# Altium integrated library all_in_one_library.IntLib: 677 symbols (part 1 of 3)
Pins are listed as number, name and electrical type; pins without a type are passive.

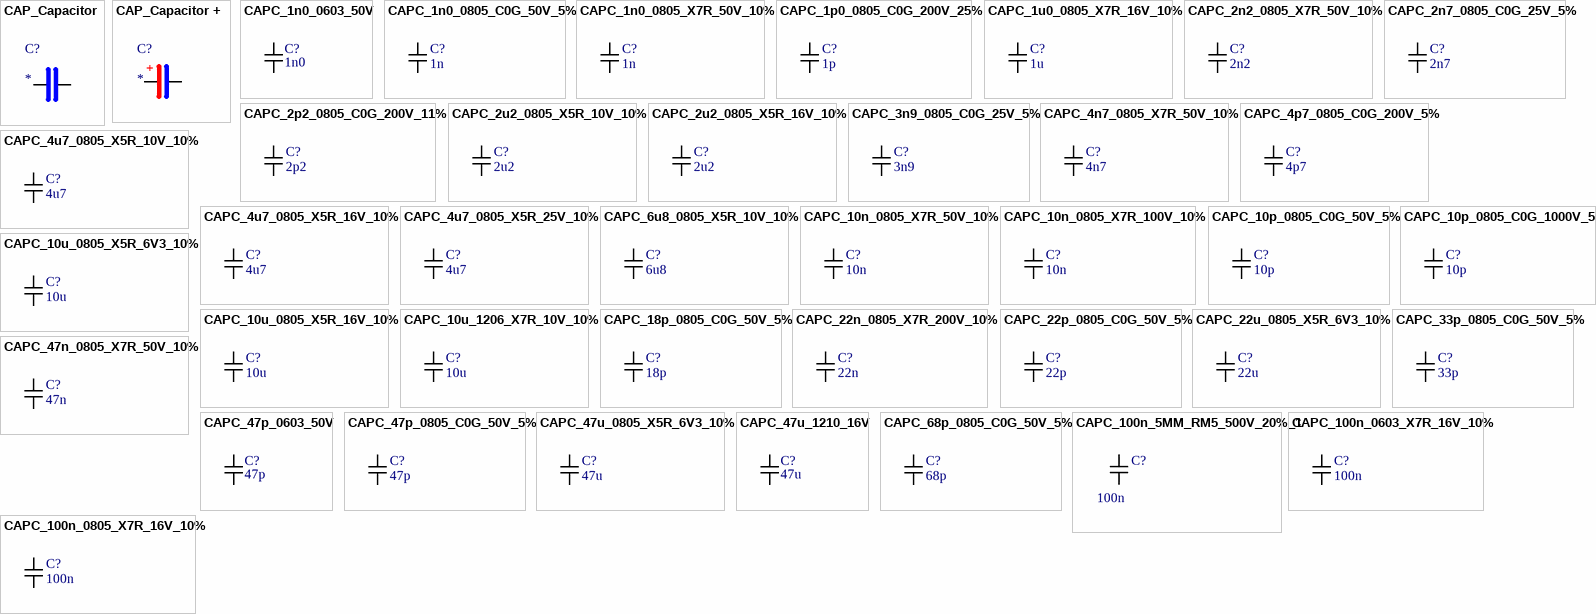
[diagram p0: symbols CAP_Capacitor to CAPC_100n_0805_X7R_16V_10%]

## CAP_Capacitor
designator C?
pins: 1, 2

## CAP_Capacitor +
designator C?
pins: 1, 2
text: +

## CAPC_1n0_0603_50V
designator C?, comment 1n0
CAPC_0603_1n0_50V
footprint CAPC_0603
pins: 1, 2

## CAPC_1n0_0805_C0G_50V_5%
designator C?  value 1n  (hidden comment: *)
CAPC 0805 1000pF; Material: ceramic; Tolerance [%]: ±5; Case [Metric]: 2012; Case [EIA]: 0805; Voltage [V]: 50; Dielectric: C0G
footprint CAPC_0805
pins: 1, 2

## CAPC_1n0_0805_X7R_50V_10%
designator C?  value 1n  (hidden comment: *)
CAPC 0805 1000pF; Material: ceramic; Tolerance [%]: ±10; Case [Metric]: 2012; Case [EIA]: 0805; Voltage [V]: 50; Dielectric: X7R
footprint CAPC_0805
pins: 1, 2

## CAPC_1p0_0805_C0G_200V_25%
designator C?  value 1p  (hidden comment: *)
CAPC 0805 1pF; Material: ceramic; Tolerance [%]: ±25; Case [Metric]: 2012; Case [EIA]: 0805; Voltage [V]: 200; Dielectric: C0G
footprint CAPC_0805
pins: 1, 2

## CAPC_1u0_0805_X7R_16V_10%
designator C?  value 1u  (hidden comment: *)
CAPC 0805 1000000pF; Material: ceramic; Tolerance [%]: ±10; Case [Metric]: 2012; Case [EIA]: 0805; Voltage [V]: 16; Dielectric: X7R
footprint CAPC_0805
pins: 1, 2

## CAPC_2n2_0805_X7R_50V_10%
designator C?  value 2n2  (hidden comment: *)
CAPC 0805 2200pF; Material: ceramic; Tolerance [%]: ±10; Case [Metric]: 2012; Case [EIA]: 0805; Voltage [V]: 50; Dielectric: X7R
footprint CAPC_0805
pins: 1, 2

## CAPC_2n7_0805_C0G_25V_5%
designator C?  value 2n7  (hidden comment: *)
CAPC 0805 2700pF; Material: ceramic; Tolerance [%]: ±5; Case [Metric]: 2012; Case [EIA]: 0805; Voltage [V]: 25; Dielectric: C0G
footprint CAPC_0805
pins: 1, 2

## CAPC_2p2_0805_C0G_200V_11%
designator C?  value 2p2  (hidden comment: *)
CAPC 0805 2.2pF; Material: ceramic; Tolerance [%]: ±11; Case [Metric]: 2012; Case [EIA]: 0805; Voltage [V]: 200; Dielectric: C0G
footprint CAPC_0805
pins: 1, 2

## CAPC_2u2_0805_X5R_10V_10%
designator C?  value 2u2  (hidden comment: *)
CAPC 0805 2200000pF; Material: ceramic; Tolerance [%]: ±10; Case [Metric]: 2012; Case [EIA]: 0805; Voltage [V]: 10; Dielectric: X5R
footprint CAPC_0805
pins: 1, 2

## CAPC_2u2_0805_X5R_16V_10%
designator C?  value 2u2  (hidden comment: *)
CAPC 0805 2200000pF; Material: ceramic; Tolerance [%]: ±10; Case [Metric]: 2012; Case [EIA]: 0805; Voltage [V]: 16; Dielectric: X5R
footprint CAPC_0805
pins: 1, 2

## CAPC_3n9_0805_C0G_25V_5%
designator C?  value 3n9  (hidden comment: *)
CAPC 0805 3900pF; Material: ceramic; Tolerance [%]: ±5; Case [Metric]: 2012; Case [EIA]: 0805; Voltage [V]: 25; Dielectric: C0G
footprint CAPC_0805
pins: 1, 2

## CAPC_4n7_0805_X7R_50V_10%
designator C?  value 4n7  (hidden comment: *)
CAPC 0805 4700pF; Material: ceramic; Tolerance [%]: ±10; Case [Metric]: 2012; Case [EIA]: 0805; Voltage [V]: 50; Dielectric: X7R
footprint CAPC_0805
pins: 1, 2

## CAPC_4p7_0805_C0G_200V_5%
designator C?  value 4p7  (hidden comment: *)
CAPC 0805 4.7pF; Material: ceramic; Tolerance [%]: ±5; Case [Metric]: 2012; Case [EIA]: 0805; Voltage [V]: 200; Dielectric: C0G
footprint CAPC_0805
pins: 1, 2

## CAPC_4u7_0805_X5R_10V_10%
designator C?  value 4u7  (hidden comment: *)
CAPC 0805 4700000pF; Material: ceramic; Tolerance [%]: ±10; Case [Metric]: 2012; Case [EIA]: 0805; Voltage [V]: 10; Dielectric: X5R
footprint CAPC_0805
pins: 1, 2

## CAPC_4u7_0805_X5R_16V_10%
designator C?  value 4u7  (hidden comment: *)
CAPC 0805 4700000pF; Material: ceramic; Tolerance [%]: ±10; Case [Metric]: 2012; Case [EIA]: 0805; Voltage [V]: 16; Dielectric: X5R
footprint CAPC_0805
pins: 1, 2

## CAPC_4u7_0805_X5R_25V_10%
designator C?  value 4u7  (hidden comment: *)
CAPC 0805 4700000pF; Material: ceramic; Tolerance [%]: ±10; Case [Metric]: 2012; Case [EIA]: 0805; Voltage [V]: 25; Dielectric: X5R
footprint CAPC_0805
pins: 1, 2

## CAPC_6u8_0805_X5R_10V_10%
designator C?  value 6u8  (hidden comment: *)
CAPC 0805 6800000pF; Material: ceramic; Tolerance [%]: ±10; Case [Metric]: 2012; Case [EIA]: 0805; Voltage [V]: 10; Dielectric: X5R
footprint CAPC_0805
pins: 1, 2

## CAPC_10n_0805_X7R_50V_10%
designator C?  value 10n  (hidden comment: *)
CAPC 0805 10000pF; Material: ceramic; Tolerance [%]: ±10; Case [Metric]: 2012; Case [EIA]: 0805; Voltage [V]: 50; Dielectric: X7R
footprint CAPC_0805
pins: 1, 2

## CAPC_10n_0805_X7R_100V_10%
designator C?  value 10n  (hidden comment: *)
CAPC 0805 10000pF; Material: ceramic; Tolerance [%]: ±10; Case [Metric]: 2012; Case [EIA]: 0805; Voltage [V]: 100; Dielectric: X7R
footprint CAPC_0805
pins: 1, 2

## CAPC_10p_0805_C0G_50V_5%
designator C?  value 10p  (hidden comment: *)
CAPC 0805 10pF; Material: ceramic; Tolerance [%]: ±5; Case [Metric]: 2012; Case [EIA]: 0805; Voltage [V]: 50; Dielectric: C0G
footprint CAPC_0805
pins: 1, 2

## CAPC_10p_0805_C0G_1000V_5%
designator C?  value 10p  (hidden comment: *)
CAPC 0805 10pF; Material: ceramic; Tolerance [%]: ±5; Case [Metric]: 2012; Case [EIA]: 0805; Voltage [V]: 1000; Dielectric: C0G
footprint CAPC_0805
pins: 1, 2

## CAPC_10u_0805_X5R_6V3_10%
designator C?  value 10u  (hidden comment: *)
CAPC 0805 10000000pF; Material: ceramic; Tolerance [%]: ±10; Case [Metric]: 2012; Case [EIA]: 0805; Dielectric: X5R; Voltage [V]: 6.3
footprint CAPC_0805
pins: 1, 2

## CAPC_10u_0805_X5R_16V_10%
designator C?  value 10u  (hidden comment: *)
CAPC 0805 10000000pF; Material: ceramic; Tolerance [%]: ±10; Case [Metric]: 2012; Case [EIA]: 0805; Voltage [V]: 16; Dielectric: X5R
footprint CAPC_0805
pins: 1, 2

## CAPC_10u_1206_X7R_10V_10%
designator C?  value 10u  (hidden comment: *)
CAPC 0805 10000000pF; Material: ceramic; Tolerance [%]: ±10; Case [Metric]: 3216; Case [EIA]: 1206; Dielectric: X7R; Voltage [V]: 10
footprint CAPC_1206
pins: 1, 2

## CAPC_18p_0805_C0G_50V_5%
designator C?  value 18p  (hidden comment: *)
CAPC 0805 18pF; Material: ceramic; Tolerance [%]: ±5; Case [Metric]: 2012; Case [EIA]: 0805; Voltage [V]: 50; Dielectric: C0G
footprint CAPC_0805
pins: 1, 2

## CAPC_22n_0805_X7R_200V_10%
designator C?  value 22n  (hidden comment: *)
CAPC 0805 22000pF; Material: ceramic; Tolerance [%]: ±10; Case [Metric]: 2012; Case [EIA]: 0805; Voltage [V]: 200; Dielectric: X7R
footprint CAPC_0805
pins: 1, 2

## CAPC_22p_0805_C0G_50V_5%
designator C?  value 22p  (hidden comment: *)
CAPC 0805 22pF; Material: ceramic; Tolerance [%]: ±5; Case [Metric]: 2012; Case [EIA]: 0805; Voltage [V]: 50; Dielectric: C0G
footprint CAPC_0805
pins: 1, 2

## CAPC_22u_0805_X5R_6V3_10%
designator C?  value 22u  (hidden comment: *)
CAPC 0805 22000000pF; Material: ceramic; Tolerance [%]: ±10; Case [Metric]: 2012; Case [EIA]: 0805; Dielectric: X5R; Voltage [V]: 6.3
footprint CAPC_0805
pins: 1, 2

## CAPC_33p_0805_C0G_50V_5%
designator C?  value 33p  (hidden comment: *)
CAPC 0805 33pF; Material: ceramic; Tolerance [%]: ±5; Case [Metric]: 2012; Case [EIA]: 0805; Voltage [V]: 50; Dielectric: C0G
footprint CAPC_0805
pins: 1, 2

## CAPC_47n_0805_X7R_50V_10%
designator C?  value 47n  (hidden comment: *)
CAPC 0805 47000pF; Material: ceramic; Tolerance [%]: ±10; Case [Metric]: 2012; Case [EIA]: 0805; Voltage [V]: 50; Dielectric: X7R
footprint CAPC_0805
pins: 1, 2

## CAPC_47p_0603_50V
designator C?, comment 47p
CAPC_0603_47p_50V
footprint CAPC_0603
pins: 1, 2

## CAPC_47p_0805_C0G_50V_5%
designator C?  value 47p  (hidden comment: *)
CAPC 0805 47pF; Material: ceramic; Tolerance [%]: ±5; Case [Metric]: 2012; Case [EIA]: 0805; Voltage [V]: 50; Dielectric: C0G
footprint CAPC_0805
pins: 1, 2

## CAPC_47u_0805_X5R_6V3_10%
designator C?  value 47u  (hidden comment: *)
CAPC 0805 47000000pF; Material: ceramic; Tolerance [%]: ±10; Case [Metric]: 2012; Case [EIA]: 0805; Dielectric: X5R; Voltage [V]: 6.3
footprint CAPC_0805
pins: 1, 2

## CAPC_47u_1210_16V
designator C?, comment 47u
CAPC_47u_1210_16V
footprint CAPC_1210
pins: 1, 2

## CAPC_68p_0805_C0G_50V_5%
designator C?  value 68p  (hidden comment: *)
CAPC 0805 68pF; Material: ceramic; Tolerance [%]: ±5; Case [Metric]: 2012; Case [EIA]: 0805; Voltage [V]: 50; Dielectric: C0G
footprint CAPC_0805
pins: 1, 2

## CAPC_100n_5MM_RM5_500V_20%_1
designator C?, comment 100n
CAPC 100nF 500V
footprint CAPC 5mm (ceramic HV)
pins: 1, 2

## CAPC_100n_0603_X7R_16V_10%
designator C?  value 100n  (hidden comment: *)
CAPC 0603 100000pF; Material: ceramic; Case [EIA]: 0603; Dielectric: X7R; Voltage: 16V; Tolerance: ±10%
footprint CAPC_0603
pins: 1, 2

## CAPC_100n_0805_X7R_16V_10%
designator C?  value 100n  (hidden comment: *)
CAPC 0805 100000pF; Material: ceramic; Tolerance [%]: ±10; Case [Metric]: 2012; Case [EIA]: 0805; Voltage [V]: 16; Dielectric: X7R
footprint CAPC_0805
pins: 1, 2

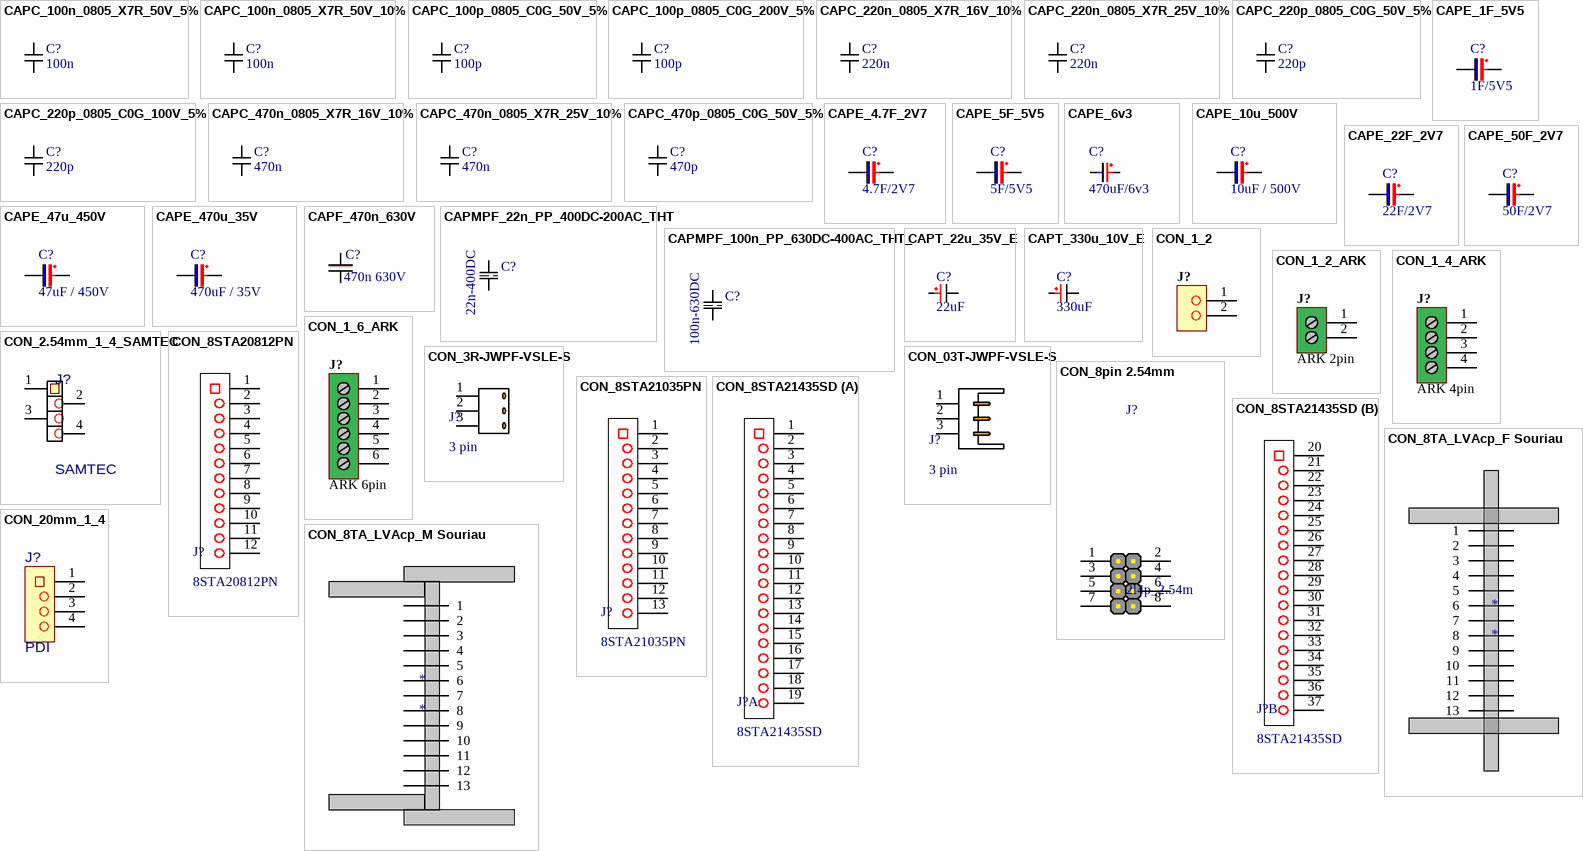
[diagram p1: symbols CAPC_100n_0805_X7R_50V_5% to CON_20mm_1_4]

## CAPC_100n_0805_X7R_50V_5%
designator C?  value 100n  (hidden comment: *)
CAPC 0805 100000pF; Material: ceramic; Tolerance [%]: ±5; Case [Metric]: 2012; Case [EIA]: 0805; Voltage [V]: 50; Dielectric: X7R
footprint CAPC_0805
pins: 1, 2

## CAPC_100n_0805_X7R_50V_10%
designator C?  value 100n  (hidden comment: *)
CAPC 0805 100000pF; Material: ceramic; Tolerance [%]: ±10; Case [Metric]: 2012; Case [EIA]: 0805; Voltage [V]: 50; Dielectric: X7R
footprint CAPC_0805
pins: 1, 2

## CAPC_100p_0805_C0G_50V_5%
designator C?  value 100p  (hidden comment: *)
CAPC 0805 100pF; Material: ceramic; Tolerance [%]: ±5; Case [Metric]: 2012; Case [EIA]: 0805; Voltage [V]: 50; Dielectric: C0G
footprint CAPC_0805
pins: 1, 2

## CAPC_100p_0805_C0G_200V_5%
designator C?  value 100p  (hidden comment: *)
CAPC 0805 100pF; Material: ceramic; Tolerance [%]: ±5; Case [Metric]: 2012; Case [EIA]: 0805; Voltage [V]: 200; Dielectric: C0G
footprint CAPC_0805
pins: 1, 2

## CAPC_220n_0805_X7R_16V_10%
designator C?  value 220n  (hidden comment: *)
CAPC 0805 220000pF; Material: ceramic; Tolerance [%]: ±10; Case [Metric]: 2012; Case [EIA]: 0805; Voltage [V]: 16; Dielectric: X7R
footprint CAPC_0805
pins: 1, 2

## CAPC_220n_0805_X7R_25V_10%
designator C?  value 220n  (hidden comment: *)
CAPC 0805 220000pF; Material: ceramic; Tolerance [%]: ±10; Case [Metric]: 2012; Case [EIA]: 0805; Voltage [V]: 25; Dielectric: X7R
footprint CAPC_0805
pins: 1, 2

## CAPC_220p_0805_C0G_50V_5%
designator C?  value 220p  (hidden comment: *)
CAPC 0805 220pF; Material: ceramic; Tolerance [%]: ±5; Case [Metric]: 2012; Case [EIA]: 0805; Voltage [V]: 50; Dielectric: C0G
footprint CAPC_0805
pins: 1, 2

## CAPC_220p_0805_C0G_100V_5%
designator C?  value 220p  (hidden comment: *)
CAPC 0805 220pF; Material: ceramic; Tolerance [%]: ±5; Case [Metric]: 2012; Case [EIA]: 0805; Voltage [V]: 100; Dielectric: C0G
footprint CAPC_0805
pins: 1, 2

## CAPC_470n_0805_X7R_16V_10%
designator C?  value 470n  (hidden comment: *)
CAPC 0805 470000pF; Material: ceramic; Tolerance [%]: ±10; Case [Metric]: 2012; Case [EIA]: 0805; Voltage [V]: 16; Dielectric: X7R
footprint CAPC_0805
pins: 1, 2

## CAPC_470n_0805_X7R_25V_10%
designator C?  value 470n  (hidden comment: *)
CAPC 0805 470000pF; Material: ceramic; Tolerance [%]: ±10; Case [Metric]: 2012; Case [EIA]: 0805; Voltage [V]: 25; Dielectric: X7R
footprint CAPC_0805
pins: 1, 2

## CAPC_470p_0805_C0G_50V_5%
designator C?  value 470p  (hidden comment: *)
CAPC 0805 470pF; Material: ceramic; Tolerance [%]: ±5; Case [Metric]: 2012; Case [EIA]: 0805; Voltage [V]: 50; Dielectric: C0G
footprint CAPC_0805
pins: 1, 2

## CAPE_1F_5V5
designator C?, comment 1F/5V5
Superkapacitor; Suplier: GES
footprint CAP_1F_21.5x8x5
pins: +, -

## CAPE_4.7F_2V7
designator C?, comment 4.7F/2V7
Superkapacitor DRL4.7/2.7; Suplier: TME; Alias: DRL4.7/2.7
footprint CAP_4F7_10x20x5mm
pins: +, -

## CAPE_5F_5V5
designator C?, comment 5F/5V5
Superkapacitor; Suplier: GES
footprint CAPE_5F_5V5
pins: +, -

## CAPE_6v3
designator C?, comment 470uF/6v3
Elektroliticky kondenzátor 8x12x4mm
footprint CAP 8x12x4mm
pins: +, -

## CAPE_10u_500V
designator C?, comment 10uF / 500V
Elektroliticky kondenzátor
footprint CAP 10x16x5mm+
pins: +, -

## CAPE_22F_2V7
designator C?, comment 22F/2V7
Superkapacitor DRL22/2.7; Suplier: TME; Alias: DRL22/2.7
footprint CAP_22F_16x25
pins: +, -

## CAPE_47u_450V
designator C?, comment 47uF / 450V
Elektroliticky kondenzátor; Alias: RAD 47/450 RM7,5; Suplier: GES
footprint CAP 16x36x7.5mm
pins: +, -

## CAPE_50F_2V7
designator C?, comment 50F/2V7
Superkapacitor DRL50/2.7; Suplier: TME; Alias: DRL50/2.7
footprint CAP_50F_18x40x
pins: +, -

## CAPE_470u_35V
designator C?, comment 470uF / 35V
Elektroliticky kondenzátor
footprint CAP 10x12.5x5mm+
pins: +, -

## CAPF_470n_630V
designator C?, comment 470n 630V
EPCOS - B32653A6474J - FOIL CAPACITOR, 0.47UF, 630V; Alias: B32653A6474J
footprint CAP B32653
pins: 1 +, 2 -

## CAPMPF_22n_PP_400DC-200AC_THT
designator C?, comment 22n-400DC
polypropylen foil 22n 400DC / 200AC; speed-grade: 600V/us; link: http://www.tme.eu/cz/details/mks2-22n_400-r/kondenzatory-tht-polyesterove/wima/mks2g022201c00ko00/; datasheet: http://www.tme.eu/cz/Document/c7e8f087b5b5822d15279eb1943cea1e/WIMA_MKS_2.pdf
footprint WIMA_3.5_8.5_7.2_5rm (polypropylen capacitor)
pins: 1, 2

## CAPMPF_100n_PP_630DC-400AC_THT_
designator C?, comment 100n-630DC
polypropylen foil 100n 630DC / 400AC; speed-grade: 900V/us; link: http://www.tme.eu/cz/details/mkp10-100n_630-r/polypropylenove-kondenzatory-standardni/wima/mkp1j031004j00ki00/; datasheet: http://www.tme.eu/cz/Document/c9c3612d9384576529f461ace7f3add8/WIMA_MKP_10.pdf
footprint WIMA_9-16-18 (polypropylen capacitor)
pins: 1, 2

## CAPT_22u_35V_E
designator C?, comment 22uF
CAPT 22u 35V case-E tatal; Manufacturer: VISHAY SPRAGUE; Manufacturer Part Number: TR3E226K035C0260; Supplier 1: Farnell; RoHS: YES; Stock 1: 21; Pricing 1: 5=17,858, 50=16,884, 100=16,234, 250=15,585, 400=14,936 (EUR); ComponentLink1URL: http://www.farnell.com/datasheets/438325.pdf; ComponentLink1Description: http://www.farnell.com/datasheets/438325.pdf; Supplier Part Number 1: 1754134
footprint CAP E-CASE TANTAL (tantal E case)
pins: +, -

## CAPT_330u_10V_E
designator C?, comment 330uF
CAPT 330u case-E tatal; Suplier: Farnell; Suplier URL: http://cz.farnell.com/vishay-sprague/293d337x9010e2te3/capacitor-tantalum-10v-330uf/dp/1754173
footprint CAP E-CASE TANTAL (tantal E case)
pins: +, -

## CON_1_2
designator J?, comment 2.54mm  (value not drawn)
KONEKTOR 2-PIN
footprint KON_1_2_2.54
pins: 1, 2

## CON_1_2_ARK
designator J?, comment ARK 2pin
KONEKTOR 2-PIN RM381; Alias: RM381
footprint CON_ARK_RM381_2T
pins: 1, 2

## CON_1_4_ARK
designator J?, comment ARK 4pin
KONEKTOR 4-PIN RM381; Alias: RM381
footprint CON_ARK_RM381_4T
pins: 1, 2, 3, 4

## CON_1_6_ARK
designator J?, comment ARK 6pin
KONEKTOR 6-PIN RM381; Alias: RM381
footprint CON_ARK_RM381_6T
pins: 1, 2, 3, 4, 5, 6

## CON_2.54mm_1_4_SAMTEC
designator J?, comment SAMTEC
1L 4P SSM connector; Link: http://cz.farnell.com/samtec/ssm-104-l-sv/receptacle-2-54mm-vert-4way/dp/1668251
footprint KON SAMTEC_1x4_SV
pins: 1, 2, 3, 4

## CON_3R-JWPF-VSLE-S
designator J?, comment 3 pin
JWPF CONNECTOR Crimp style wire-to-wire connectors
pins: 1, 2, 3

## CON_03T-JWPF-VSLE-S
designator J?, comment 3 pin
JWPF CONNECTOR Crimp style wire-to-wire connectors
pins: 1, 2, 3

## CON_8pin 2.54mm
designator J?, comment 2l4p_2.54m
8pin 2.54mm
footprint HDR_4x2_2,54mm
pins: 1, 2, 3, 4, 5, 6, 7, 8
1 alternate drawing of the same symbol

## CON_8STA20812PN
designator J?, comment 8STA20812PN
footprint Con_8STA20812PN
pins: 1, 2, 3, 4, 5, 6, 7, 8, 9, 10, 11, 12

## CON_8STA21035PN
designator J?, comment 8STA21035PN
footprint Con_8STA21035PN (Footprint not found)
pins: 1, 2, 3, 4, 5, 6, 7, 8, 9, 10, 11, 12, 13

## CON_8STA21435SD
designator J?, comment 8STA21435SD
footprint Con_8STA21435SD
part A pins: 1, 2, 3, 4, 5, 6, 7, 8, 9, 10, 11, 12, 13, 14, 15, 16, 17, 18, 19
part B pins: 20, 21, 22, 23, 24, 25, 26, 27, 28, 29, 30, 31, 32, 33, 34, 35, 36, 37

## CON_8TA_LVAcp_F Souriau
designator *
13 Female
pins: 1, 2, 3, 4, 5, 6, 7, 8, 9, 10, 11, 12, 13

## CON_8TA_LVAcp_M Souriau
designator *
13 Male
pins: 1, 2, 3, 4, 5, 6, 7, 8, 9, 10, 11, 12, 13

## CON_20mm_1_4
designator J?, comment PDI
1line 4pins
footprint KON_20_1_4 (20mm)
pins: 1, 2, 3, 4

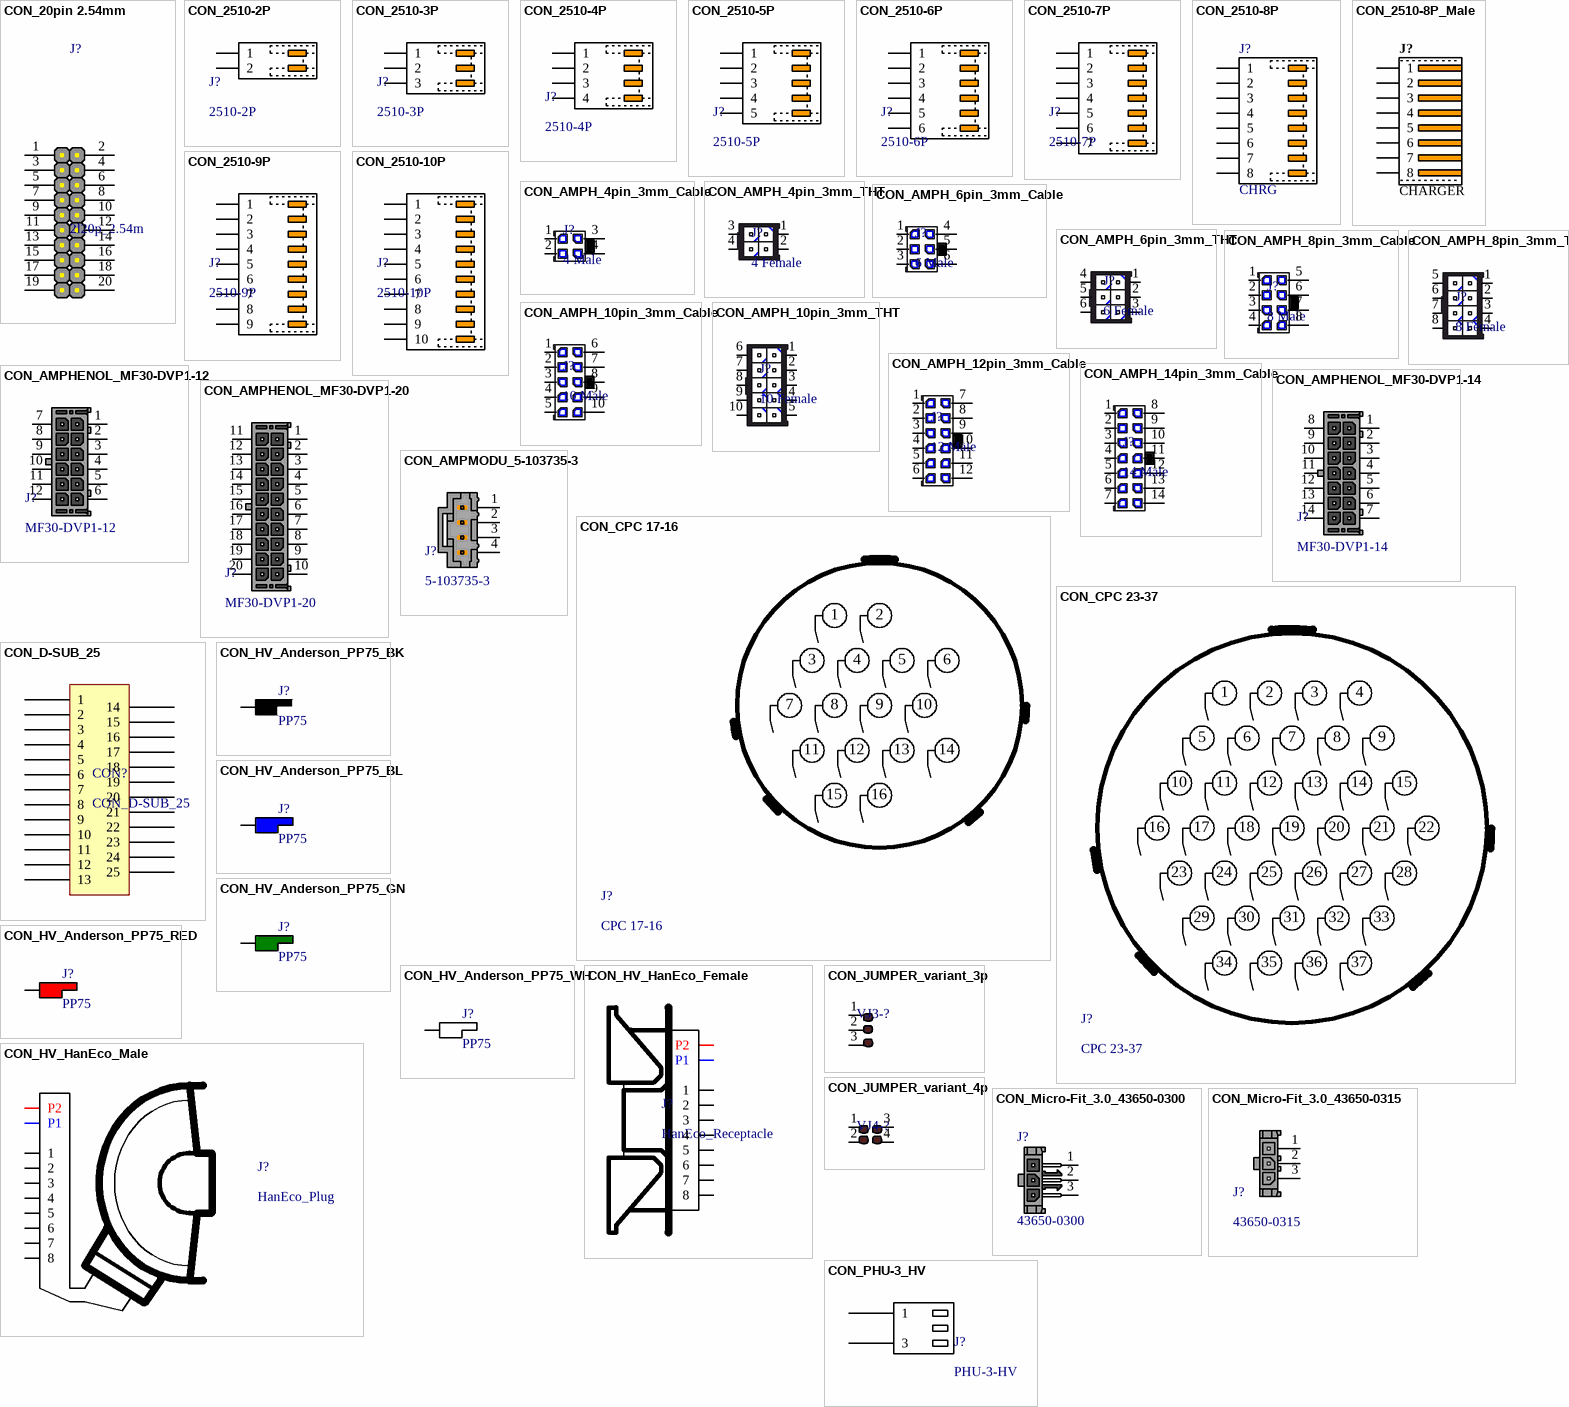
[diagram p2: symbols CON_20pin 2.54mm to CON_PHU-3_HV]

## CON_20pin 2.54mm
designator J?, comment 2l20p_2.54m
20pin 2.54mm
footprint KON IDE 2x10 LATCHES
footprint CON_SMT_20PIN_2_54mm
footprint MODULE_BODY
pins: 1, 2, 3, 4, 5, 6, 7, 8, 9, 10, 11, 12, 13, 14, 15, 16, 17, 18, 19, 20
1 alternate drawing of the same symbol

## CON_2510-2P
designator J?, comment 2510-2P  (mechanical)
2510 series connector
pins: 1, 2

## CON_2510-3P
designator J?, comment 2510-3P  (mechanical)
2510 series connector
pins: 1, 2, 3

## CON_2510-4P
designator J?, comment 2510-4P  (mechanical)
2510 series connector
pins: 1, 2, 3, 4

## CON_2510-5P
designator J?, comment 2510-5P  (mechanical)
2510 series connector
pins: 1, 2, 3, 4, 5

## CON_2510-6P
designator J?, comment 2510-6P  (mechanical)
2510 series connector
pins: 1, 2, 3, 4, 5, 6

## CON_2510-7P
designator J?, comment 2510-7P  (mechanical)
2510 series connector
pins: 1, 2, 3, 4, 5, 6, 7

## CON_2510-8P
designator J?, comment CHRG  (mechanical)
2510 series Female connnector
pins: 1, 2, 3, 4, 5, 6, 7, 8

## CON_2510-8P_Male
designator J?, comment CHARGER
2510 series Male connector
footprint CON_2510_8_male
pins: 1, 2, 3, 4, 5, 6, 7, 8

## CON_2510-9P
designator J?, comment 2510-9P  (mechanical)
2510 series connector
pins: 1, 2, 3, 4, 5, 6, 7, 8, 9

## CON_2510-10P
designator J?, comment 2510-10P  (mechanical)
2510 series connector
pins: 1, 2, 3, 4, 5, 6, 7, 8, 9, 10

## CON_AMPH_4pin_3mm_Cable
designator J?, comment 4 Male
MF30-HFD1-4 Amphenol
pins: 1, 2, 3, 4

## CON_AMPH_4pin_3mm_THT
designator J?, comment 4 Female
MF30-DVP1-4 Amphenol; Suplier: TME
footprint CON_AMPH_MF30-DVP1-4
pins: 1, 2, 3, 4

## CON_AMPH_6pin_3mm_Cable
designator J?, comment 6 Male
MF30-HFD1-6 Amphenol
pins: 1, 2, 3, 4, 5, 6

## CON_AMPH_6pin_3mm_THT
designator J?, comment 6 Female
MF30-DVP1-6 Amphenol; Suplier: TME
footprint CON_AMPH_MF30-DVP1-6
pins: 1, 2, 3, 4, 5, 6

## CON_AMPH_8pin_3mm_Cable
designator J?, comment 8 Male
MF30-HFD1-8 Amphenol
pins: 1, 2, 3, 4, 5, 6, 7, 8

## CON_AMPH_8pin_3mm_THT
designator J?, comment 8 Female
MF30-DVP1-8 Amphenol; Suplier: TME
footprint CON_AMPH_MF30-DVP1-8
pins: 1, 2, 3, 4, 5, 6, 7, 8

## CON_AMPH_10pin_3mm_Cable
designator J?, comment 10 Male
MF30-HFD1-10 Amphenol
pins: 1, 2, 3, 4, 5, 6, 7, 8, 9, 10

## CON_AMPH_10pin_3mm_THT
designator J?, comment 10 Female
MF30-DVP1-10 Amphenol; Suplier: TME
footprint CON_AMPH_MF30-DVP1-10
pins: 1, 2, 3, 4, 5, 6, 7, 8, 9, 10

## CON_AMPH_12pin_3mm_Cable
designator J?, comment 12 Male
MF30-HFD1-12 Amphenol
pins: 1, 2, 3, 4, 5, 6, 7, 8, 9, 10, 11, 12

## CON_AMPH_14pin_3mm_Cable
designator J?, comment 14 Male
MF30-HFD1-14 Amphenol; Suplier: TME
pins: 1, 2, 3, 4, 5, 6, 7, 8, 9, 10, 11, 12, 13, 14

## CON_AMPHENOL_MF30-DVP1-12
designator J?, comment MF30-DVP1-12
12pin 3.0mm Header
footprint CON_AMPHENOL_MF30-DVP1-12 (Footprint not found)
pins: 1, 2, 3, 4, 5, 6, 7, 8, 9, 10, 11, 12

## CON_AMPHENOL_MF30-DVP1-14
designator J?, comment MF30-DVP1-14
14pin 3.0mm Header
footprint CON_AMPHENOL_MF30-DVP1-14
pins: 1, 2, 3, 4, 5, 6, 7, 8, 9, 10, 11, 12, 13, 14

## CON_AMPHENOL_MF30-DVP1-20
designator J?, comment MF30-DVP1-20
20pin 3.0mm Header
footprint CON_AMPHENOL_MF30-DVP1-20 (Footprint not found)
pins: 1, 2, 3, 4, 5, 6, 7, 8, 9, 10, 11, 12, 13, 14, 15, 16, 17, 18, 19, 20

## CON_AMPMODU_5-103735-3
designator J?, comment 5-103735-3
AMPMODU TE
footprint CON_AMPMODU_5-103735-3 (4 pinovy !!)
pins: 1, 2, 3, 4

## CON_CPC 17-16
designator J?, comment CPC 17-16
TE Circular Plastic Connector Series 1
pins: 1, 2, 3, 4, 5, 6, 7, 8, 9, 10, 11, 12, 13, 14, 15, 16

## CON_CPC 23-37
designator J?, comment CPC 23-37
TE Circular Plastic Connector Series 1
pins: 1, 2, 3, 4, 5, 6, 7, 8, 9, 10, 11, 12, 13, 14, 15, 16, 17, 18, 19, 20, 21, 22, 23, 24, 25, 26, 27, 28, 29, 30, 31, 32, 33, 34, 35, 36, 37

## CON_D-SUB_25
designator CON?
D-SUB 25
footprint D-SUB_25
pins: 1, 2, 3, 4, 5, 6, 7, 8, 9, 10, 11, 12, 13, 14, 15, 16, 17, 18, 19, 20, 21, 22, 23, 24, 25

## CON_HV_Anderson_PP75_BK
designator J?, comment PP75
Anderson_PP75_BK
pins: 1

## CON_HV_Anderson_PP75_BL
designator J?, comment PP75
Anderson_PP75_BL
pins: 1

## CON_HV_Anderson_PP75_GN
designator J?, comment PP75
Anderson_PP75_GN
pins: 1

## CON_HV_Anderson_PP75_RED
designator J?, comment PP75
Anderson_PP75_RED
pins: 1

## CON_HV_Anderson_PP75_WH
designator J?, comment PP75
Anderson_PP75_WH
pins: 1

## CON_HV_HanEco_Female
designator J?, comment HanEco_Receptacle
pins: 1, 2, 3, 4, 5, 6, 7, 8, P1, P2

## CON_HV_HanEco_Male
designator J?, comment HanEco_Plug
pins: 1, 2, 3, 4, 5, 6, 7, 8, P1, P2

## CON_JUMPER_variant_3p
designator VJ3-?, comment VJ3  (value not drawn)
smd variant jumper
footprint VJ-3P (Variant-placement-Jumper)
pins: 1, 2, 3

## CON_JUMPER_variant_4p
designator VJ4-?, comment VJ4  (value not drawn)
smd variant jumper
footprint VJ-4P (Variant-placement-Jumper)
pins: 1, 2, 3, 4

## CON_Micro-Fit_3.0_43650-0300
designator J?, comment 43650-0300
Micro-Fit 3.0 Molex; Supplier 1: Farnell; Supplier Part Number 1: 1012231
footprint CON_Micro-Fit_3.0_43650-0300
pins: 1, 2, 3

## CON_Micro-Fit_3.0_43650-0315
designator J?, comment 43650-0315
Micro-Fit 3.0 Molex
footprint CON_Micro-Fit_3.0_43650-0315
footprint CON_Micro-Fit_3.0_43650-0315-HVfootprint (HV version)
pins: 1, 2, 3

## CON_PHU-3_HV
designator J?, comment PHU-3-HV
3,96 mm PHU series connector
pins: 1, 3

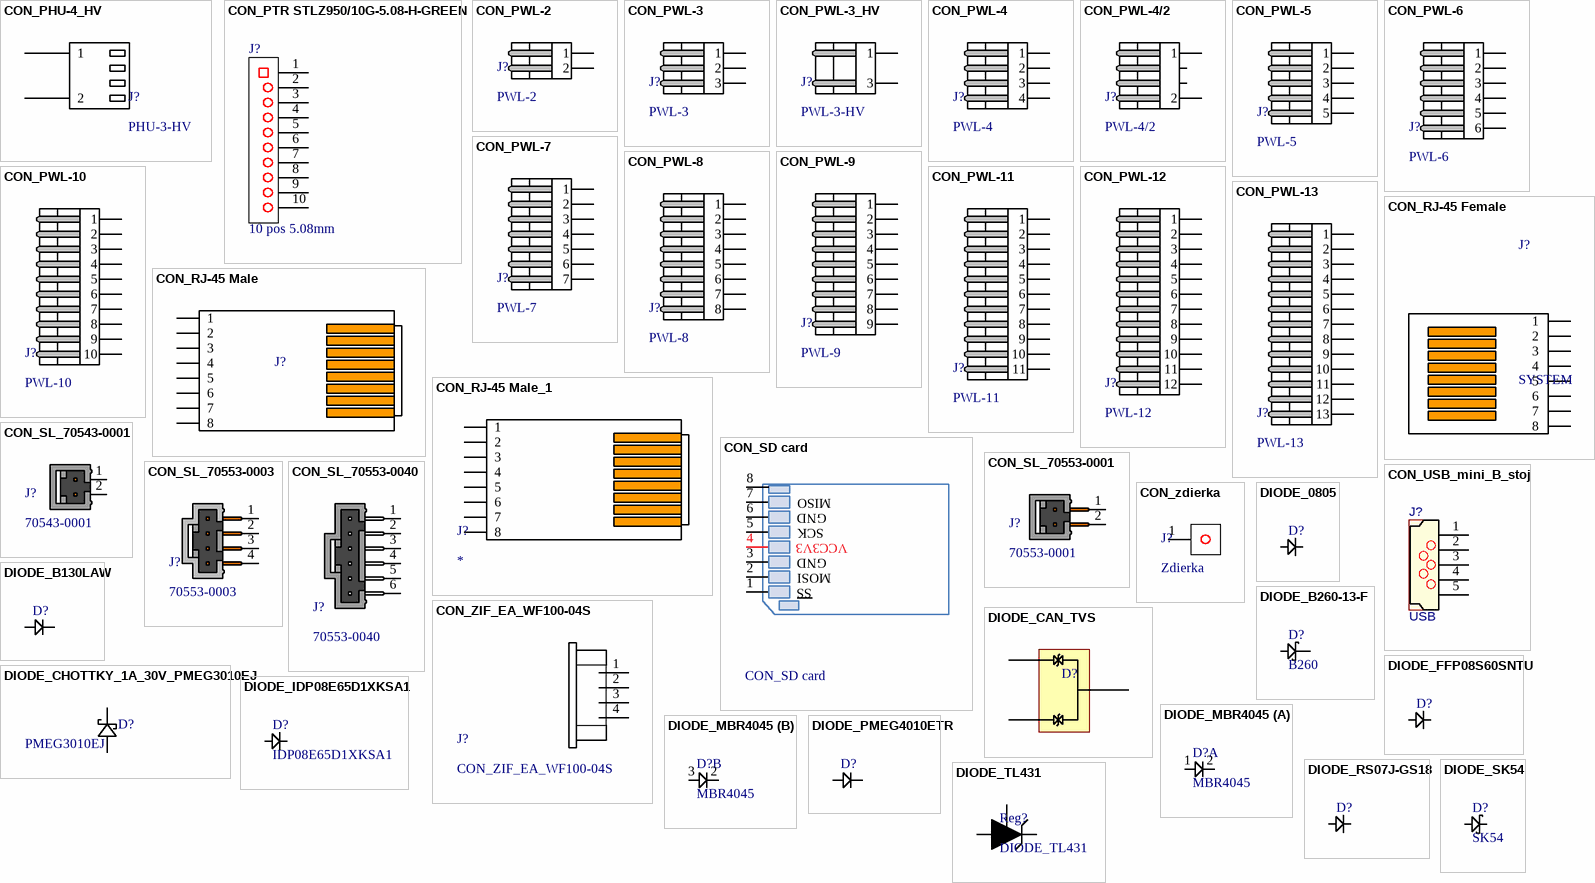
[diagram p3: symbols CON_PHU-4_HV to DIODE_TL431]

## CON_PHU-4_HV
designator J?, comment PHU-3-HV
3,96 mm PHU series connector
pins: 1, 2

## CON_PTR STLZ950/10G-5.08-H-GREEN
designator J?, comment 10 pos 5.08mm
10 pos, 5.08mm
footprint Kon PTR STLZ950/10G-5.08-H-GREEN
footprint Kon PTR STLZ950/10G-5.08-H-GREEN
pins: 1, 2, 3, 4, 5, 6, 7, 8, 9, 10

## CON_PWL-2
designator J?, comment PWL-2
3,96 mm PWL series connector
pins: 1, 2

## CON_PWL-3
designator J?, comment PWL-3
3,96 mm PWL series connector
footprint Kon PWL-3
pins: 1, 2, 3

## CON_PWL-3_HV
designator J?, comment PWL-3-HV
3,96 mm PWL series connector
footprint KON PWL-3 HV
pins: 1, 3

## CON_PWL-4
designator J?, comment PWL-4
3,96 mm PWL series connector
footprint CON_PWL-4
pins: 1, 2, 3, 4

## CON_PWL-4/2
designator J?, comment PWL-4/2
3,96 mm PWL series connector
footprint CON_PWL-4/2
pins: 1, 2

## CON_PWL-5
designator J?, comment PWL-5
3,96 mm PWL series connector
pins: 1, 2, 3, 4, 5

## CON_PWL-6
designator J?, comment PWL-6
3,96 mm PWL series connector
pins: 1, 2, 3, 4, 5, 6

## CON_PWL-7
designator J?, comment PWL-7
3,96 mm PWL series connector
pins: 1, 2, 3, 4, 5, 6, 7

## CON_PWL-8
designator J?, comment PWL-8
3,96 mm PWL series connector
pins: 1, 2, 3, 4, 5, 6, 7, 8

## CON_PWL-9
designator J?, comment PWL-9
3,96 mm PWL series connector
pins: 1, 2, 3, 4, 5, 6, 7, 8, 9

## CON_PWL-10
designator J?, comment PWL-10
3,96 mm PWL series connector
pins: 1, 2, 3, 4, 5, 6, 7, 8, 9, 10

## CON_PWL-11
designator J?, comment PWL-11
3,96 mm PWL series connector
pins: 1, 2, 3, 4, 5, 6, 7, 8, 9, 10, 11

## CON_PWL-12
designator J?, comment PWL-12
3,96 mm PWL series connector
pins: 1, 2, 3, 4, 5, 6, 7, 8, 9, 10, 11, 12

## CON_PWL-13
designator J?, comment PWL-13
3,96 mm PWL series connector
pins: 1, 2, 3, 4, 5, 6, 7, 8, 9, 10, 11, 12, 13

## CON_RJ-45 Female
designator J?, comment SYSTEM
Female
footprint Kon RJ-45 V SMD
pins: 1, 2, 3, 4, 5, 6, 7, 8

## CON_RJ-45 Male
designator J?, comment RJ-45  (value not drawn)
Male RJ-45
pins: 1, 2, 3, 4, 5, 6, 7, 8

## CON_RJ-45 Male_1
designator J?  (mechanical)
pins: 1, 2, 3, 4, 5, 6, 7, 8

## CON_SD card
designator U?
footprint SD_micro_attend
pins: 1 ~{SS}, 2 MOSI, 3 GND, 4 VCC3V3, 5 SCK, 6 GND, 7 MISO, 8 9
text: SS

## CON_SL_70543-0001
designator J?, comment 70543-0001
MOLEX SL; Supplier 1: Farnell; Supplier Part Number 1: 1756933
footprint CON_SL_70543-0001 (Footprint not found)
pins: 1, 2

## CON_SL_70553-0001
designator J?, comment 70553-0001
MOLEX SL; Supplier 1: Farnell; Supplier Part Number 1: 2060691
footprint CON_SL_70553-0001
pins: 1, 2

## CON_SL_70553-0003
designator J?, comment 70553-0003
MOLEX SL; Supplier 1: Farnell; Supplier Part Number 1: 1462925
footprint CON_SL_70553-0003 (Footprint not found)
pins: 1, 2, 3, 4

## CON_SL_70553-0040
designator J?, comment 70553-0040
MOLEX SL; Supplier 1: Farnell; Supplier Part Number 1: 2313709
footprint CON_SL_70553-0040 (Footprint not found)
pins: 1, 2, 3, 4, 5, 6
